# Altium footprint library PCB库.PcbLib: 46 footprints (part 1 of 3)
Each footprint in its own frame and in the unit in brackets; x right, y up, seen from the top. Pads: shape width x height; smd on the part's side, far side on the other; paste and mask are expansions set on the pad; w line width, h text height; cw(c..) or ccw(c..) is an arc to the next point about the centre after c.
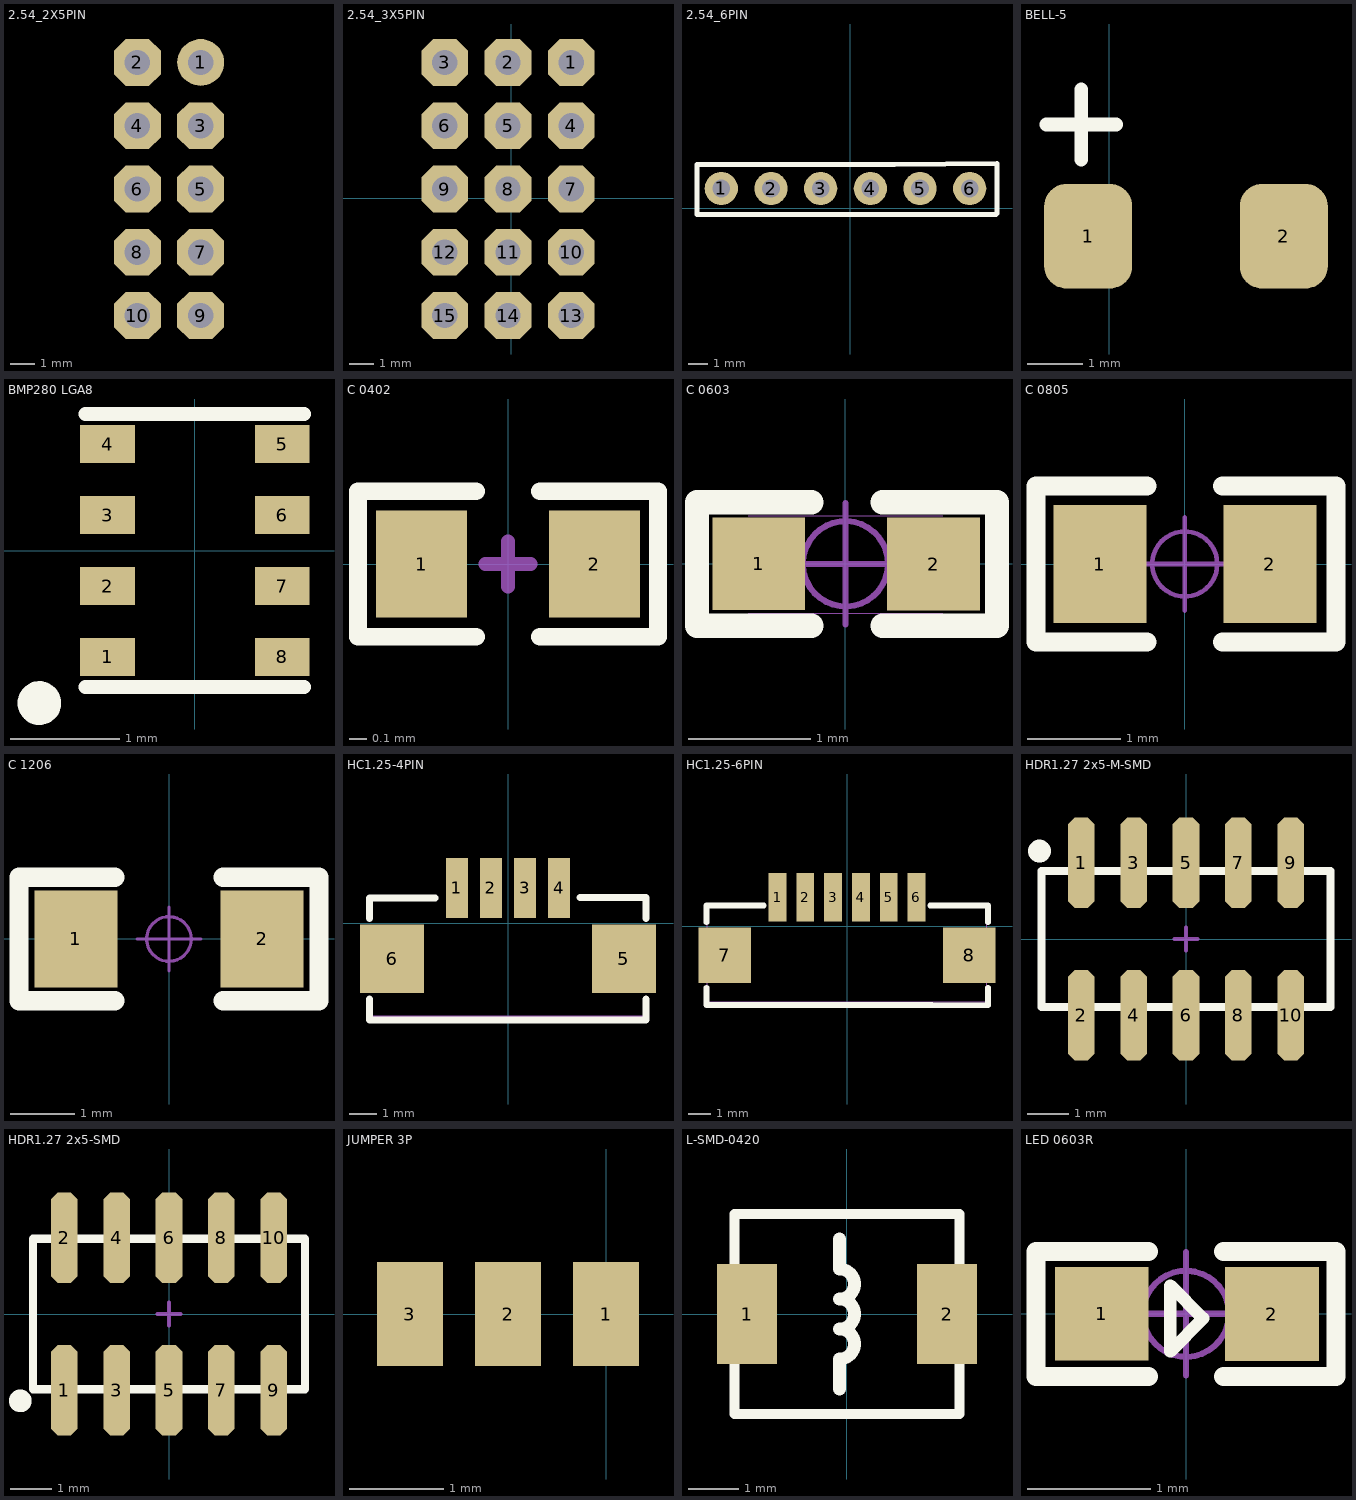
[diagram p0: the footprints below, top view; thin cyan lines are the x and y axes]

## 2.54_2X5PIN [mil]
pads (10):
  round 74 hole 40: 1(3535,13255)
  oct 74x74 / inner round 68.37 / far side oct 74x74 hole 40: 2(3435,13255) 3(3535,13155) 4(3435,13155) 5(3535,13055) 6(3435,13055) 7(3535,12955) 8(3435,12955) 9(3535,12855) 10(3435,12855)
Mechanical 3:
  region: 3525,13265 3545,13265 3545,13245 3525,13245
  region: 3425,13265 3445,13265 3445,13245 3425,13245
  region: 3525,13165 3545,13165 3545,13145 3525,13145
  region: 3425,13165 3445,13165 3445,13145 3425,13145
  region: 3525,13065 3545,13065 3545,13045 3525,13045
  region: 3425,13065 3445,13065 3445,13045 3425,13045
  region: 3425,12965 3445,12965 3445,12945 3425,12945
  region: 3525,12965 3545,12965 3545,12945 3525,12945
  region: 3525,12865 3545,12865 3545,12845 3525,12845
  region: 3425,12865 3445,12865 3445,12845 3425,12845

## 2.54_3X5PIN [mil]
pads (15):
  oct 74x74 / inner round 74 / far side round 74 hole 40: 1(95,215)
  oct 74x74 / inner round 68.37 / far side oct 74x74 hole 40: 2(-5,215) 3(-105,215) 4(95,115) 5(-5,115) 6(-105,115) 7(95,15) 8(-5,15) 9(-105,15) 10(95,-85) 11(-5,-85) 12(-105,-85) 13(95,-185) 14(-5,-185) 15(-105,-185)
Mechanical 3:
  region: -115,-175 -95,-175 -95,-195 -115,-195
  region: -15,-175 5,-175 5,-195 -15,-195
  region: 85,-175 105,-175 105,-195 85,-195
  region: -115,-75 -95,-75 -95,-95 -115,-95
  region: 85,-75 105,-75 105,-95 85,-95
  region: -15,-75 5,-75 5,-95 -15,-95
  region: -115,25 -95,25 -95,5 -115,5
  region: -15,25 5,25 5,5 -15,5
  region: 85,25 105,25 105,5 85,5
  region: -15,125 5,125 5,105 -15,105
  region: -115,125 -95,125 -95,105 -115,105
  region: -115,225 -95,225 -95,205 -115,205
  region: 85,125 105,125 105,105 85,105
  region: -15,225 5,225 5,205 -15,205
  region: 85,225 105,225 105,205 85,205

## 2.54_6PIN [mm]
pads (6):
  round 1.7 hole 0.9: 1(-6.607,1.016) 2(-4.064,1.016) 3(-1.524,1.016) 4(1.016,1.016) 5(3.556,1.016) 6(6.096,1.016)
Top Overlay:
  lines w0.254: -7.849,-0.305 2.261,-0.305 7.442,-0.305 7.493,-0.254 7.493,2.286 2.261,2.235 -7.849,2.235 -7.849,-0.305

## BELL-5 [mm]
pads (2):
  rrect50% 1.6x1.9 smd: 1(-0.381,-5.842) 2(3.175,-5.842)
Top Overlay:
  lines w0.254: -1.143,-3.81 0.127,-3.81 ; -0.508,-4.445 -0.508,-3.175

## BMP280 LGA8 [mm]
pads (8):
  rect 0.5x0.35 smd: 1(-0.8,-0.975) 2(-0.8,-0.325) 3(-0.8,0.325) 4(-0.8,0.975) 5(0.8,0.975) 6(0.8,0.325) 7(0.8,-0.325) 8(0.8,-0.975)
Top Overlay:
  circle w0.2: c-1.424,-1.397 r0.1
  lines w0.127: -1,-1.25 1,-1.25 ; -1,1.25 1,1.25
3D body "User Library-BST-BMP280.STEP": height 1, standoff 0, extent -1.025,-1.23 0.975,1.27

## C 0402 [mil]
pads (2):
  rect 20x23.62 smd: 1(-19,0) 2(19,0)
Top Overlay:
  lines w3.94: -7,-16 -33,-16 -33,16 -7,16 ; 7,-16 33,-16 33,16 7,16
Mechanical 15:
  lines w3: -5,0 5,0 ; 0,-5 0,5
3D body "C 0402.STEP": height 20.08, standoff -0.39, extent -19.68,-10.24 19.68,10.24

## C 0603 [mil]
pads (2):
  rect 30x30 smd: 1(-28,0) 2(28.5,-0.06)
Top Overlay:
  lines w7.87: -11,-20.06 -48,-20.06 -48,19.94 -11,19.94 ; 12,-20.06 49,-20.06 49,19.94 12,19.94
Mechanical 13:
  lines w0.39: -31.5,-16 31.5,-16 ; -31.5,15.5 31.5,15.5
Mechanical 15:
  circle w1.97: c0,0 r13.78
  lines w1.97: -19.68,0 19.68,0 ; 0,-19.68 0,19.68
3D body "C 0603.STEP": height 31.89, standoff -0.39, extent -31.5,-16.14 31.5,16.14

## C 0805 [mm]
pads (2):
  rect 1x1.27 smd: 1(-0.914,0) 2(0.914,0)
Top Overlay:
  lines w0.203: -0.406,-0.838 -1.6,-0.838 -1.6,0.838 -0.406,0.838 ; 0.406,-0.838 1.626,-0.838 1.626,0.838 0.406,0.838
Mechanical 15:
  circle w0.05: c0,0 r0.35
  lines w0.05: -0.5,0 0.5,0 ; 0,-0.5 0,0.5
3D body "C 0805.STEP": height 0.51, standoff -0.01, extent -1,-0.61 1,0.61

## C 1206 [mil]
pads (2):
  rect 51.18x60 smd: 1(-57.5,0) 2(57.5,0)
Top Overlay:
  lines w12: -33.46,-38 -92.52,-38 -92.52,38 -33.46,38 ; 33.46,-38 92.52,-38 92.52,38 33.46,38
Mechanical 15:
  circle w1.97: c0,0 r13.78
  lines w1.97: -19.68,0 19.68,0 ; 0,-19.68 0,19.68
3D body "C 1206.STEP": height 47.64, standoff -0.39, extent -62.99,-31.89 62.99,31.89

## HC1.25-4PIN [mm]
pads (6):
  rect 0.8x2.2 smd paste+0 mask+0.05: 1(-1.875,1.3) 2(-0.625,1.3) 3(0.625,1.3) 4(1.875,1.3)
  rect 2.35x2.5 smd paste+0 mask+0.05: 5(4.255,-1.3) 6(-4.255,-1.3)
Top Overlay:
  lines w0.254: -5.08,-2.781 -5.08,-3.55 5.06,-3.55 5.06,-2.781 ; -5.08,0.181 -5.08,0.93 -2.67,0.93 ; 2.65,0.95 5.06,0.95 5.06,0.181
Mechanical 15:
  region: 2.025,1.84 2.025,0.64 1.725,0.64 1.725,1.84
  region: 0.775,1.84 0.775,0.64 0.475,0.64 0.475,1.84
  region: -0.475,1.84 -0.475,0.64 -0.775,0.64 -0.775,1.84
  region: -1.725,1.84 -1.725,0.64 -2.025,0.64 -2.025,1.84
  region: 5,-2.15 3.5,-2.15 3.5,-0.45 5,-0.45
  region: -3.505,-2.15 -5.005,-2.15 -5.005,-0.45 -3.505,-0.45
  lines w0.051: -5,-3.41 5,-3.41

## HC1.25-6PIN [mm]
pads (8):
  rect 0.8x2.2 smd paste+0 mask+0.05: 1(-3.125,1.3) 2(-1.875,1.3) 3(-0.625,1.3) 4(0.625,1.3) 5(1.875,1.3) 6(3.125,1.3)
  rect 2.35x2.5 smd paste+0 mask+0.05: 7(-5.505,-1.3) 8(5.505,-1.3)
Top Overlay:
  lines w0.254: -6.33,-2.781 -6.33,-3.55 3.81,-3.55 ; -6.33,0.181 -6.33,0.93 -3.92,0.93 -3.756,0.93 ; 3.756,0.93 6.35,0.93 6.35,0.181 ; 3.81,-3.556 6.35,-3.556 6.35,-2.781
Mechanical 15:
  region: 3.275,1.84 3.275,0.64 2.975,0.64 2.975,1.84
  region: 2.025,1.84 2.025,0.64 1.725,0.64 1.725,1.84
  region: 6.25,-2.15 4.75,-2.15 4.75,-0.45 6.25,-0.45
  region: 0.775,1.84 0.775,0.64 0.475,0.64 0.475,1.84
  region: -0.475,1.84 -0.475,0.64 -0.775,0.64 -0.775,1.84
  region: -1.725,1.84 -1.725,0.64 -2.025,0.64 -2.025,1.84
  region: -2.975,1.84 -2.975,0.64 -3.275,0.64 -3.275,1.84
  region: -4.755,-2.15 -6.255,-2.15 -6.255,-0.45 -4.755,-0.45
  lines w0.051: -6.3,0.84 -6.3,-3.41 6.3,-3.41 6.3,0.84

## HDR1.27 2x5-M-SMD [mm]
pads (10):
  oct 0.65x2.2 smd: 1(-2.54,1.85) 2(-2.54,-1.85) 3(-1.27,1.85) 4(-1.27,-1.85) 5(0,1.85) 6(0,-1.85) 7(1.27,1.85) 8(1.27,-1.85) 9(2.54,1.85) 10(2.54,-1.85)
Top Overlay:
  circle w0.5: c-3.556,2.134 r0.025
  lines w0.2: -3.505,-1.651 -3.505,1.651 3.505,1.651 3.505,-1.651 -3.505,-1.651
Mechanical 15:
  lines w0.102: -0.279,0 0.279,0 ; 0,-0.279 0,0.279
3D body "29755.stp": height 4.77, standoff 0.07, extent -3.353,-2.095 3.378,2.095

## HDR1.27 2x5-SMD [mm]
pads (10):
  oct 0.65x2.2 smd: 1(-2.54,-1.85) 2(-2.54,1.85) 3(-1.27,-1.85) 4(-1.27,1.85) 5(0,-1.85) 6(0,1.85) 7(1.27,-1.85) 8(1.27,1.85) 9(2.54,-1.85) 10(2.54,1.85)
Top Overlay:
  circle w0.5: c-3.607,-2.108 r0.025
  lines w0.2: -3.302,-1.829 -3.302,1.829 3.302,1.829 3.302,-1.829 -3.302,-1.829
Mechanical 15:
  lines w0.102: -0.279,0 0.279,0 ; 0,-0.279 0,0.279
3D body "User Library-RM127_10pin_Header.STEP": height 4.6, standoff 0.1, extent -3.175,-2.75 3.175,2.75

## JUMPER 3P [mm]
pads (3):
  rect 0.7x1.1 smd: 1(0,0) 2(-1.041,0) 3(-2.083,0)

## L-SMD-0420 [mm]
pads (2):
  rect 1.2x2 smd: 1(-2,0) 2(2,0)
Top Overlay:
  lines w0.2: -2.25,-2 2.25,-2 2.25,2 -2.25,2 -2.25,-2
  lines w0.254: -0.15,-1.5 -0.15,-0.9 ccw(c-0.15,-0.6) -0.15,-0.3 ccw(c-0.15,0) -0.15,0.3 ccw(c-0.15,0.6) -0.15,0.9 -0.15,1.5
3D body "User Library-0420CDMCB_DS.STEP": height 1.91, standoff -0.01, extent -2.25,-2.068 2.25,2.032

## LED 0603R [mil]
pads (2):
  rect 30x30 smd: 1(-27,0) 2(27.5,-0.06)
Top Overlay:
  lines w4: -5,-12 5.5,-1.5 -5,9 -5,-12
  lines w6: -12,-20.06 -48,-20.06 -48,19.94 -12,19.94 ; 12,-20.06 48,-20.06 48,19.94 12,19.94
Mechanical 15:
  circle w1.97: c0,0 r13.78
  lines w1.97: -19.68,0 19.68,0 ; 0,-19.68 0,19.68
3D body "LED 0603玻璃罩.STEP": height 23.82, standoff 8.07, extent -23.58,-15.79 23.58,15.79
3D body "LED 0603-R.STEP": height 18.36, standoff -0.16, extent -31.49,-15.78 31.5,15.79